# Altium footprint library Connectors.PcbLib: 101 footprints (part 2 of 7)
Each footprint in its own frame and in the unit in brackets; x right, y up, seen from the top. Pads: shape width x height; smd on the part's side, far side on the other; paste and mask are expansions set on the pad; w line width, h text height; cw(c..) or ccw(c..) is an arc to the next point about the centre after c.
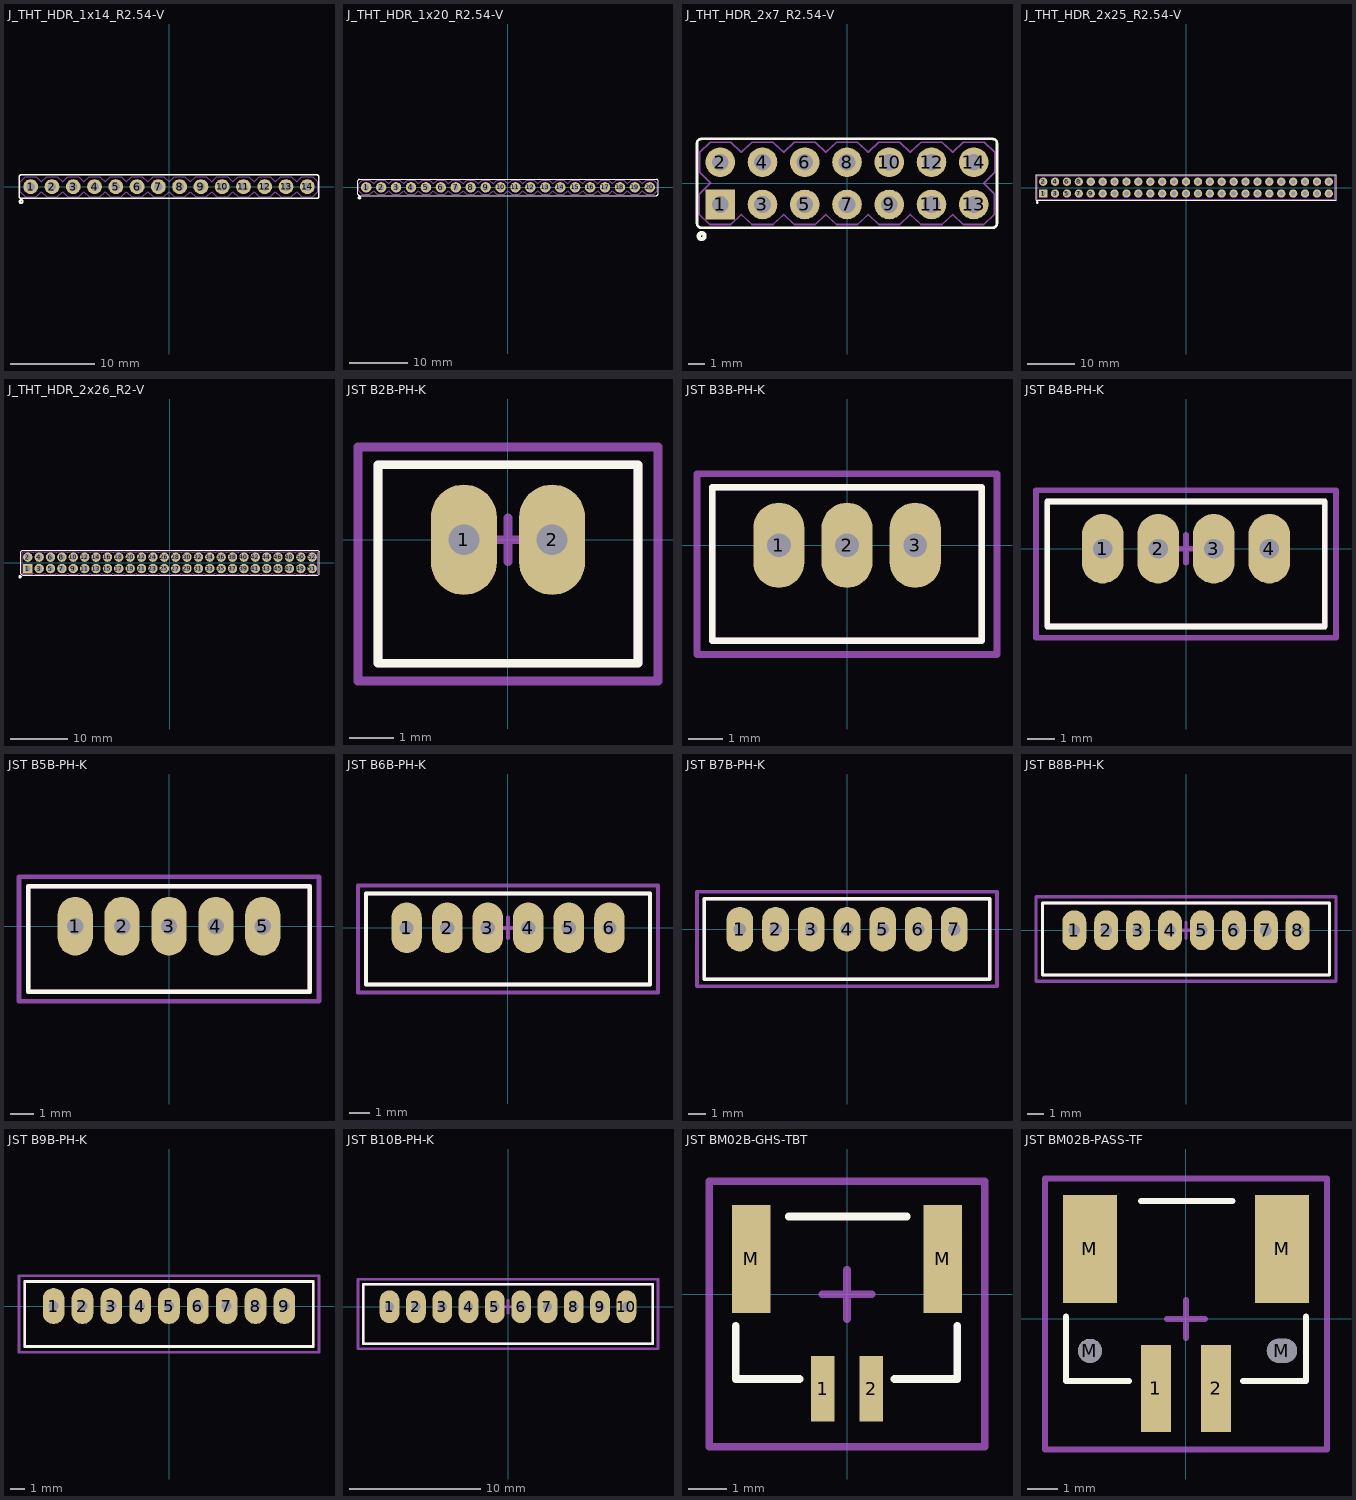
[diagram p1: the footprints below, top view; thin cyan lines are the x and y axes]

## J_THT_HDR_1x14_R2.54-V [mil] "EMED"
height 456.69
pads (14):
  round 70 hole 40: 1(-650,0) 2(-550,0) 3(-450,0) 4(-350,0) 5(-250,0) 6(-150,0) 7(-50,0) 8(50,0) 9(150,0) 10(250,0) 11(350,0) 12(450,0) 13(550,0) 14(650,0)
Top Overlay:
  circle w10: c-695,-70 r7
  lines w6: -705,-45 ccw(c-695,-45) -695,-55 695,-55 ccw(c695,-45) 705,-45 705,45 ccw(c695,45) 695,55 -695,55 ccw(c-695,45) -705,45 -705,-45
Mechanical 1:
  lines w3.94: -700,-23.62 -675,-47.24 -625,-47.24 -600,-23.62 -575,-47.24 -525,-47.24 -500,-23.62 -475,-47.24 -425,-47.24 -400,-23.62 -375,-47.24 -325,-47.24 -300,-23.62 -275,-47.24 -225,-47.24 -200,-23.62 -175,-47.24 -125,-47.24 -100,-23.62 -75,-47.24 -25,-47.24 0,-23.62 25,-47.24 75,-47.24 100,-23.62 125,-47.24 175,-47.24 200,-23.62 225,-47.24 275,-47.24 300,-23.62 325,-47.24 375,-47.24 400,-23.62 425,-47.24 475,-47.24 500,-23.62 525,-47.24 575,-47.24 600,-23.62 625,-47.24 675,-47.24 700,-23.62 700,23.62 675,47.24 625,47.24 600,23.62 575,47.24 525,47.24 500,23.62 475,47.24 425,47.24 400,23.62 375,47.24 325,47.24 300,23.62 275,47.24 225,47.24 200,23.62 175,47.24 125,47.24 100,23.62 75,47.24 25,47.24 0,23.62 -25,47.24 -75,47.24 -100,23.62 -125,47.24 -175,47.24 -200,23.62 -225,47.24 -275,47.24 -300,23.62 -325,47.24 -375,47.24 -400,23.62 -425,47.24 -475,47.24 -500,23.62 -525,47.24 -575,47.24 -600,23.62 -625,47.24 -675,47.24 -700,23.62 -700,-23.62
3D body: height 78.74, standoff 0, extent -700,-47.24 700,47.24
3D body: height 338.58, standoff -114.17, extent -661.81,-11.81 -638.19,11.81
3D body: height 338.58, standoff -114.17, extent -561.81,-11.81 -538.19,11.81
3D body: height 338.58, standoff -114.17, extent -461.81,-11.81 -438.19,11.81
3D body: height 338.58, standoff -114.17, extent -361.81,-11.81 -338.19,11.81
3D body: height 338.58, standoff -114.17, extent -261.81,-11.81 -238.19,11.81
3D body: height 338.58, standoff -114.17, extent -161.81,-11.81 -138.19,11.81
3D body: height 338.58, standoff -114.17, extent -61.81,-11.81 -38.19,11.81
3D body: height 338.58, standoff -114.17, extent 38.19,-11.81 61.81,11.81
3D body: height 338.58, standoff -114.17, extent 138.19,-11.81 161.81,11.81
3D body: height 338.58, standoff -114.17, extent 238.19,-11.81 261.81,11.81
3D body: height 338.58, standoff -114.17, extent 338.19,-11.81 361.81,11.81
3D body: height 338.58, standoff -114.17, extent 438.19,-11.81 461.81,11.81
3D body: height 338.58, standoff -114.17, extent 538.19,-11.81 561.81,11.81
3D body: height 338.58, standoff -114.17, extent 638.19,-11.81 661.81,11.81

## J_THT_HDR_1x20_R2.54-V [mil] "1x20pin, listwa mêska, THT, prosta"
pads (20):
  round 70 hole 40: 1(-950,0) 2(-850,0) 3(-750,0) 4(-650,0) 5(-550,0) 6(-450,0) 7(-350,0) 8(-250,0) 9(-150,0) 10(-50,0) 11(50,0) 12(150,0) 13(250,0) 14(350,0) 15(450,0) 16(550,0) 17(650,0) 18(750,0) 19(850,0) 20(950,0)
Top Overlay:
  circle w10: c-995,-70 r7
  lines w6: -1005,-45 ccw(c-995,-45) -995,-55 995,-55 ccw(c995,-45) 1005,-45 1005,45 ccw(c995,45) 995,55 -995,55 ccw(c-995,45) -1005,45 -1005,-45
Mechanical 1:
  lines w3.94: -1000,-23.62 -975,-47.24 -925,-47.24 -900,-23.62 -875,-47.24 -825,-47.24 -800,-23.62 -775,-47.24 -725,-47.24 -700,-23.62 -675,-47.24 -625,-47.24 -600,-23.62 -575,-47.24 -525,-47.24 -500,-23.62 -475,-47.24 -425,-47.24 -400,-23.62 -375,-47.24 -325,-47.24 -300,-23.62 -275,-47.24 -225,-47.24 -200,-23.62 -175,-47.24 -125,-47.24 -100,-23.62 -75,-47.24 -25,-47.24 0,-23.62 25,-47.24 75,-47.24 100,-23.62 125,-47.24 175,-47.24 200,-23.62 225,-47.24 275,-47.24 300,-23.62 325,-47.24 375,-47.24 400,-23.62 425,-47.24 475,-47.24 500,-23.62 525,-47.24 575,-47.24 600,-23.62 625,-47.24 675,-47.24 700,-23.62 725,-47.24 775,-47.24 800,-23.62 825,-47.24 875,-47.24 900,-23.62 925,-47.24 975,-47.24 1000,-23.62 1000,23.62 975,47.24 925,47.24 900,23.62 875,47.24 825,47.24 800,23.62 775,47.24 725,47.24 700,23.62 675,47.24 625,47.24 600,23.62 575,47.24 525,47.24 500,23.62 475,47.24 425,47.24 400,23.62 375,47.24 325,47.24 300,23.62 275,47.24 225,47.24 200,23.62 175,47.24 125,47.24 100,23.62 75,47.24 25,47.24 0,23.62 -25,47.24 -75,47.24 -100,23.62 -125,47.24 -175,47.24 -200,23.62 -225,47.24 -275,47.24 -300,23.62 -325,47.24 -375,47.24 -400,23.62 -425,47.24 -475,47.24 -500,23.62 -525,47.24 -575,47.24 -600,23.62 -625,47.24 -675,47.24 -700,23.62 -725,47.24 -775,47.24 -800,23.62 -825,47.24 -875,47.24 -900,23.62 -925,47.24 -975,47.24 -1000,23.62 -1000,-23.62
3D body: height 78.74, standoff 0, extent -1000,-47.24 1000,47.24
3D body: height 338.58, standoff -114.17, extent -961.81,-11.81 -938.19,11.81
3D body: height 338.58, standoff -114.17, extent -861.81,-11.81 -838.19,11.81
3D body: height 338.58, standoff -114.17, extent -761.81,-11.81 -738.19,11.81
3D body: height 338.58, standoff -114.17, extent -661.81,-11.81 -638.19,11.81
3D body: height 338.58, standoff -114.17, extent -561.81,-11.81 -538.19,11.81
3D body: height 338.58, standoff -114.17, extent -461.81,-11.81 -438.19,11.81
3D body: height 338.58, standoff -114.17, extent -361.81,-11.81 -338.19,11.81
3D body: height 338.58, standoff -114.17, extent -261.81,-11.81 -238.19,11.81
3D body: height 338.58, standoff -114.17, extent -161.81,-11.81 -138.19,11.81
3D body: height 338.58, standoff -114.17, extent -61.81,-11.81 -38.19,11.81
3D body: height 338.58, standoff -114.17, extent 38.19,-11.81 61.81,11.81
3D body: height 338.58, standoff -114.17, extent 138.19,-11.81 161.81,11.81
3D body: height 338.58, standoff -114.17, extent 238.19,-11.81 261.81,11.81
3D body: height 338.58, standoff -114.17, extent 338.19,-11.81 361.81,11.81
3D body: height 338.58, standoff -114.17, extent 438.19,-11.81 461.81,11.81
3D body: height 338.58, standoff -114.17, extent 538.19,-11.81 561.81,11.81
3D body: height 338.58, standoff -114.17, extent 638.19,-11.81 661.81,11.81
3D body: height 338.58, standoff -114.17, extent 738.19,-11.81 761.81,11.81
3D body: height 338.58, standoff -114.17, extent 838.19,-11.81 861.81,11.81
3D body: height 338.58, standoff -114.17, extent 938.19,-11.81 961.81,11.81

## J_THT_HDR_2x7_R2.54-V [mil] "EMED"
height 456.69
pads (14):
  rect 70x70 hole 40: 1(-300,-50)
  round 70 hole 40: 2(-300,50) 3(-200,-50) 4(-200,50) 5(-100,-50) 6(-100,50) 7(0,-50) 8(0,50) 9(100,-50) 10(100,50) 11(200,-50) 12(200,50) 13(300,-50) 14(300,50)
Top Overlay:
  circle w10: c-344.09,-124.8 r7
  lines w6: -355,-10.63 -355,95 cw(c-345,95) -345,105 345,105 cw(c345,95) 355,95 355,-6.69 ; -355,-5 -355,-95 ccw(c-345,-95) -345,-105 345,-105 ccw(c345,-95) 355,-95 355,-5
Mechanical 1:
  lines w3.94: -350,-73.62 -350,-26.38 -350,-25.98 -322.83,1.18 -323.43,1.18 -348.62,26.38 -348.62,73.62 -323.62,97.24 -275,97.24 -250,73.62 -225,97.24 -175,97.24 -150,73.62 -125,97.24 -75,97.24 -50,73.62 -25,97.24 25,97.24 50,73.62 75,97.24 125,97.24 150,73.62 175,97.24 225,97.24 250,73.62 275,97.24 325,97.24 350,73.62 350,26.38 324.8,1.18 323.82,0.2 348.62,-24.61 348.62,-26.38 348.62,-73.62 323.62,-97.24 275,-97.24 250,-73.62 225,-97.24 175,-97.24 150,-73.62 125,-97.24 75,-97.24 50,-73.62 25,-97.24 -25,-97.24 -50,-73.62 -75,-97.24 -125,-97.24 -150,-73.62 -175,-97.24 -225,-97.24 -250,-73.62 -275,-97.24 -325,-97.24 -350,-73.62
3D body: height 338.58, standoff -114.17, extent 288.19,-61.81 311.81,-38.19
3D body: height 338.58, standoff -114.17, extent 188.19,-61.81 211.81,-38.19
3D body: height 338.58, standoff -114.17, extent 88.19,-61.81 111.81,-38.19
3D body: height 338.58, standoff -114.17, extent -11.81,-61.81 11.81,-38.19
3D body: height 338.58, standoff -114.17, extent -111.81,-61.81 -88.19,-38.19
3D body: height 338.58, standoff -114.17, extent -211.81,-61.81 -188.19,-38.19
3D body: height 338.58, standoff -114.17, extent -311.81,-61.81 -288.19,-38.19
3D body: height 78.74, standoff 0, extent -350,-97.24 348.62,1.18
3D body: height 78.74, standoff 0, extent -348.62,-2.76 350,97.24
3D body: height 338.58, standoff -114.17, extent 288.19,38.19 311.81,61.81
3D body: height 338.58, standoff -114.17, extent 188.19,38.19 211.81,61.81
3D body: height 338.58, standoff -114.17, extent 88.19,38.19 111.81,61.81
3D body: height 338.58, standoff -114.17, extent -11.81,38.19 11.81,61.81
3D body: height 338.58, standoff -114.17, extent -111.81,38.19 -88.19,61.81
3D body: height 338.58, standoff -114.17, extent -211.81,38.19 -188.19,61.81
3D body: height 338.58, standoff -114.17, extent -311.81,38.19 -288.19,61.81

## J_THT_HDR_2x25_R2.54-V [mil] "EMED"
height 456.69
pads (50):
  rect 70x70 hole 40: 1(-1200,-50)
  round 70 hole 40: 2(-1200,50) 3(-1100,-50) 4(-1100,50) 5(-1000,-50) 6(-1000,50) 7(-900,-50) 8(-900,50) 9(-800,-50) 10(-800,50) 11(-700,-50) 12(-700,50) 13(-600,-50) 14(-600,50) 15(-500,-50) 16(-500,50) 17(-400,-50) 18(-400,50) 19(-300,-50) 20(-300,50) 21(-200,-50) 22(-200,50) 23(-100,-50) 24(-100,50) 25(0,-50) 26(0,50) 27(100,-50) 28(100,50) 29(200,-50) 30(200,50) 31(300,-50) 32(300,50) 33(400,-50) 34(400,50) 35(500,-50) 36(500,50) 37(600,-50) 38(600,50) 39(700,-50) 40(700,50) 41(800,-50) 42(800,50) 43(900,-50) 44(900,50) 45(1000,-50) 46(1000,50) 47(1100,-50) 48(1100,50) 49(1200,-50) 50(1200,50)
Top Overlay:
  circle w10: c-1250,-125 r7
  rectangle: 1190,-60 1210,-40
  rectangle: 1190,40 1210,60
  rectangle: 890,-60 910,-40
  rectangle: 890,40 910,60
  rectangle: 1090,-60 1110,-40
  rectangle: 990,-60 1010,-40
  rectangle: 1090,40 1110,60
  rectangle: 990,40 1010,60
  rectangle: 790,-60 810,-40
  rectangle: 790,40 810,60
  rectangle: 490,-60 510,-40
  rectangle: 390,-60 410,-40
  rectangle: 290,-60 310,-40
  rectangle: 490,40 510,60
  rectangle: 390,40 410,60
  rectangle: 290,40 310,60
  rectangle: 690,-60 710,-40
  rectangle: 590,-60 610,-40
  rectangle: 190,-60 210,-40
  rectangle: 90,-60 110,-40
  rectangle: 690,40 710,60
  rectangle: 590,40 610,60
  rectangle: 190,40 210,60
  rectangle: 90,40 110,60
  rectangle: -310,-60 -290,-40
  rectangle: -410,-60 -390,-40
  rectangle: -310,40 -290,60
  rectangle: -410,40 -390,60
  rectangle: -810,-60 -790,-40
  rectangle: -810,40 -790,60
  rectangle: -210,-60 -190,-40
  rectangle: -210,40 -190,60
  rectangle: -910,40 -890,60
  rectangle: -910,-60 -890,-40
  rectangle: -710,-60 -690,-40
  rectangle: -610,-60 -590,-40
  rectangle: -1010,-60 -990,-40
  rectangle: -1210,-60 -1190,-40
  rectangle: -1110,-60 -1090,-40
  rectangle: -710,40 -690,60
  rectangle: -610,40 -590,60
  rectangle: -1010,40 -990,60
  rectangle: -1210,40 -1190,60
  rectangle: -1110,40 -1090,60
  rectangle: -110,-60 -90,-40
  rectangle: -510,-60 -490,-40
  rectangle: -510,40 -490,60
  rectangle: -110,40 -90,60
  rectangle: -10,-60 10,-40
  rectangle: -10,40 10,60
  lines w6: -1260,-108.27 1260,-108.27 1260,108.26 -1260,108.26 -1260,-108.27
Mechanical 1:
  lines w3.94: -1250,-98.43 -1250,98.42 1250,98.42 1250,-98.43 -1250,-98.43
3D body "HDR2X25.stp": height 316.54, standoff -136.22, extent -1249,-101 1251,99

## J_THT_HDR_2x26_R2-V [mil] "EMED"
height 460.63
pads (52):
  rect 65x65 hole 40: 1(-984.25,-39.37)
  round 65 hole 40: 2(-984.25,39.37) 3(-905.51,-39.37) 4(-905.51,39.37) 5(-826.77,-39.37) 6(-826.77,39.37) 7(-748.03,-39.37) 8(-748.03,39.37) 9(-669.29,-39.37) 10(-669.29,39.37) 11(-590.55,-39.37) 12(-590.55,39.37) 13(-511.81,-39.37) 14(-511.81,39.37) 15(-433.07,-39.37) 16(-433.07,39.37) 17(-354.33,-39.37) 18(-354.33,39.37) 19(-275.59,-39.37) 20(-275.59,39.37) 21(-196.85,-39.37) 22(-196.85,39.37) 23(-118.11,-39.37) 24(-118.11,39.37) 25(-39.37,-39.37) 26(-39.37,39.37) 27(39.37,-39.37) 28(39.37,39.37) 29(118.11,-39.37) 30(118.11,39.37) 31(196.85,-39.37) 32(196.85,39.37) 33(275.59,-39.37) 34(275.59,39.37) 35(354.33,-39.37) 36(354.33,39.37) 37(433.07,-39.37) 38(433.07,39.37) 39(511.81,-39.37) 40(511.81,39.37) 41(590.55,-39.37) 42(590.55,39.37) 43(669.29,-39.37) 44(669.29,39.37) 45(748.03,-39.37) 46(748.03,39.37) 47(826.77,-39.37) 48(826.77,39.37) 49(905.51,-39.37) 50(905.51,39.37) 51(984.25,-39.37) 52(984.25,39.37)
Top Overlay:
  circle w10: c-1038,-95 r7
  lines w5.98: -1031.5,-73.5 -1031.5,78.5 -1023.39,86.61 1023.39,86.61 1031.5,78.5 1031.5,-78.5 1023.39,-86.61 -1018.39,-86.61 -1031.5,-73.5
Mechanical 1:
  drawing of 158 lines, arcs and shapes, not listed
3D body: height 342.52, standoff -118.11, extent 29.53,29.53 49.21,49.21
3D body: height 342.52, standoff -118.11, extent 29.53,-49.21 49.21,-29.53
3D body: height 342.52, standoff -118.11, extent -49.21,29.53 -29.53,49.21
3D body: height 342.52, standoff -118.11, extent -49.21,-49.21 -29.53,-29.53
3D body: height 342.52, standoff -118.11, extent -127.95,29.53 -108.27,49.21
3D body: height 342.52, standoff -118.11, extent -127.95,-49.21 -108.27,-29.53
3D body: height 342.52, standoff -118.11, extent -206.69,29.53 -187.01,49.21
3D body: height 342.52, standoff -118.11, extent -206.69,-49.21 -187.01,-29.53
3D body: height 342.52, standoff -118.11, extent -285.43,29.53 -265.75,49.21
3D body: height 342.52, standoff -118.11, extent -285.43,-49.21 -265.75,-29.53
3D body: height 342.52, standoff -118.11, extent -364.17,29.53 -344.49,49.21
3D body: height 342.52, standoff -118.11, extent -364.18,-49.21 -344.49,-29.53
3D body: height 342.52, standoff -118.11, extent -442.91,29.53 -423.23,49.21
3D body: height 342.52, standoff -118.11, extent -442.92,-49.21 -423.23,-29.53
3D body: height 342.52, standoff -118.11, extent -521.65,29.53 -501.97,49.21
3D body: height 342.52, standoff -118.11, extent -521.66,-49.21 -501.97,-29.53
3D body: height 342.52, standoff -118.11, extent -600.39,29.53 -580.71,49.21
3D body: height 342.52, standoff -118.11, extent -600.4,-49.21 -580.71,-29.53
3D body: height 342.52, standoff -118.11, extent -679.13,29.53 -659.45,49.21
3D body: height 342.52, standoff -118.11, extent -679.14,-49.21 -659.45,-29.53
3D body: height 342.52, standoff -118.11, extent -757.88,29.53 -738.19,49.21
3D body: height 342.52, standoff -118.11, extent -757.88,-49.21 -738.19,-29.53
3D body: height 78.74, standoff 3.94, extent 0,-78.74 85,78.74
3D body: height 78.74, standoff 3.94, extent -78.74,-78.74 10,78.74
3D body: height 78.74, standoff 3.94, extent -157.48,-78.74 -70,78.74
3D body: height 78.74, standoff 3.94, extent -236.22,-78.74 -150,78.74
3D body: height 78.74, standoff 3.94, extent -314.96,-78.74 -230,78.74
3D body: height 78.74, standoff 3.94, extent -393.7,-78.74 -305,78.74
3D body: height 78.74, standoff 3.94, extent -472.44,-78.74 -385,78.74
3D body: height 78.74, standoff 3.94, extent -551.18,-78.74 -465,78.74
3D body: height 78.74, standoff 3.94, extent -629.92,-78.74 -545,78.74
3D body: height 78.74, standoff 3.94, extent -708.66,-78.74 -625,78.74
3D body: height 78.74, standoff 3.94, extent -787.4,-78.74 -705,78.74
3D body: height 78.74, standoff 3.94, extent -944.88,-78.74 -860,78.74
3D body: height 342.52, standoff -118.11, extent -915.36,-49.21 -895.67,-29.53
3D body: height 342.52, standoff -118.11, extent -915.36,29.53 -895.67,49.21
3D body: height 342.52, standoff -118.11, extent -994.1,29.53 -974.41,49.21
3D body: height 342.52, standoff -118.11, extent -994.1,-49.21 -974.41,-29.53
3D body: height 78.74, standoff 0, extent -1023.62,-78.74 -940,78.74
3D body: height 78.74, standoff 3.94, extent -866.14,-78.74 -785,78.74
3D body: height 342.52, standoff -118.11, extent -836.62,-49.21 -816.93,-29.53
3D body: height 342.52, standoff -118.11, extent -836.62,29.53 -816.93,49.21
3D body: height 78.74, standoff 3.94, extent 78.74,-78.74 165,78.74
3D body: height 78.74, standoff 3.94, extent 157.48,-78.74 245,78.74
3D body: height 78.74, standoff 3.94, extent 236.22,-78.74 325,78.74
3D body: height 78.74, standoff 3.94, extent 314.96,-78.74 405,78.74
3D body: height 78.74, standoff 3.94, extent 393.7,-78.74 480,78.74
3D body: height 78.74, standoff 3.94, extent 472.44,-78.74 565,78.74
3D body: height 78.74, standoff 3.94, extent 551.18,-78.74 640,78.74
3D body: height 78.74, standoff 3.94, extent 629.92,-78.74 715,78.74
3D body: height 78.74, standoff 3.94, extent 708.66,-78.74 795,78.74
3D body: height 342.52, standoff -118.11, extent 108.27,-49.21 127.95,-29.53
3D body: height 342.52, standoff -118.11, extent 108.27,29.53 127.95,49.21
3D body: height 342.52, standoff -118.11, extent 187.01,-49.21 206.69,-29.53
3D body: height 342.52, standoff -118.11, extent 187.01,29.53 206.69,49.21
3D body: height 342.52, standoff -118.11, extent 265.75,-49.21 285.43,-29.53
3D body: height 342.52, standoff -118.11, extent 265.75,29.53 285.43,49.21
3D body: height 342.52, standoff -118.11, extent 344.49,-49.21 364.17,-29.53
3D body: height 342.52, standoff -118.11, extent 344.49,29.53 364.17,49.21
3D body: height 342.52, standoff -118.11, extent 423.23,-49.21 442.91,-29.53
3D body: height 342.52, standoff -118.11, extent 423.23,29.53 442.91,49.21
3D body: height 342.52, standoff -118.11, extent 501.97,-49.21 521.65,-29.53
3D body: height 342.52, standoff -118.11, extent 501.97,29.53 521.65,49.21
3D body: height 342.52, standoff -118.11, extent 580.71,-49.21 600.39,-29.53
3D body: height 342.52, standoff -118.11, extent 580.71,29.53 600.39,49.21
3D body: height 342.52, standoff -118.11, extent 659.45,-49.21 679.13,-29.53
3D body: height 342.52, standoff -118.11, extent 659.45,29.53 679.13,49.21
3D body: height 342.52, standoff -118.11, extent 738.19,-49.21 757.87,-29.53
3D body: height 342.52, standoff -118.11, extent 738.19,29.53 757.87,49.21
3D body: height 342.52, standoff -118.11, extent 895.67,29.53 915.35,49.21
3D body: height 342.52, standoff -118.11, extent 895.67,-49.21 915.35,-29.53
3D body: height 342.52, standoff -118.11, extent 816.93,29.53 836.61,49.21
3D body: height 342.52, standoff -118.11, extent 816.93,-49.21 836.61,-29.53
3D body: height 78.74, standoff 3.94, extent 866.14,-78.74 950,78.74
3D body: height 78.74, standoff 3.94, extent 787.4,-78.74 875,78.74
3D body: height 78.74, standoff 3.94, extent 944.88,-78.74 1023.62,78.74
3D body: height 342.52, standoff -118.11, extent 974.41,-49.21 994.09,-29.53
3D body: height 342.52, standoff -118.11, extent 974.41,29.53 994.09,49.21

## JST B2B-PH-K [mm]
height 6
pads (2):
  oval 1.5x2.5 hole 0.7: 1(-1,0) 2(1,0)
Top Overlay:
  lines w0.2: -2.95,-2.8 2.95,-2.8 2.95,1.7 -2.95,1.7 -2.95,-2.8
Bottom Overlay:
  circle w0.254: c-2.1,1.1 r0.141
Mechanical 13:
  lines w0.2: -2.95,-2.8 -2.95,1.7 2.95,1.7 2.95,-2.8 -2.95,-2.8
Mechanical 15:
  lines w0.2: -0.5,0 0.5,0 ; 0,-0.5 0,0.5 ; -3.4,-3.2 -3.4,2.1 3.4,2.1 3.4,-3.2 -3.4,-3.2
3D body "JST B2B-PH-K-S.STEP": height 6, standoff -3.4, extent -2.95,-2.8 2.95,1.7

## JST B3B-PH-K [mm]
height 6
pads (3):
  oval 1.5x2.5 hole 0.7: 1(-2,0) 2(0,0) 3(2,0)
Top Overlay:
  lines w0.2: -3.95,-2.8 3.95,-2.8 3.95,1.7 -3.95,1.7 -3.95,-2.8
Bottom Overlay:
  circle w0.254: c-3.1,1.1 r0.141
Mechanical 13:
  lines w0.2: -3.95,-2.8 -3.95,1.7 3.95,1.7 3.95,-2.8 -3.95,-2.8
Mechanical 15:
  lines w0.2: -0.5,0 0.5,0 ; 0,-0.5 0,0.5 ; -4.4,-3.2 -4.4,2.1 4.4,2.1 4.4,-3.2 -4.4,-3.2
3D body "JST B3B-PH-K-S.STEP": height 6, standoff -3.4, extent -3.95,-2.8 3.95,1.7

## JST B4B-PH-K [mm]
height 6
pads (4):
  oval 1.5x2.5 hole 0.7: 1(-3,0) 2(-1,0) 3(1,0) 4(3,0)
Top Overlay:
  lines w0.2: -5,-2.8 5,-2.8 5,1.7 -5,1.7 -5,-2.8
Bottom Overlay:
  circle w0.254: c-4.1,1.1 r0.141
Mechanical 13:
  lines w0.2: -5,-2.8 -5,1.7 5,1.7 5,-2.8 -5,-2.8
Mechanical 15:
  lines w0.2: -0.5,0 0.5,0 ; 0,-0.5 0,0.5 ; -5.4,-3.2 -5.4,2.1 5.4,2.1 5.4,-3.2 -5.4,-3.2
3D body "JST B4B-PH-K-S.STEP": height 6, standoff -3.4, extent -4.95,-2.8 4.95,1.7

## JST B5B-PH-K [mm]
height 6
pads (5):
  oval 1.5x2.5 hole 0.7: 1(-4,0) 2(-2,0) 3(0,0) 4(2,0) 5(4,0)
Top Overlay:
  lines w0.2: -6,-2.8 -6,1.7 6,1.7 6,-2.8 -6,-2.8
Bottom Overlay:
  circle w0.254: c-5.1,1.1 r0.141
Mechanical 13:
  lines w0.2: -6,-2.8 6,-2.8 6,1.7 -6,1.7 -6,-2.8
Mechanical 15:
  lines w0.2: -0.5,0 0.5,0 ; 0,-0.5 0,0.5 ; -6.4,-3.2 6.4,-3.2 6.4,2.1 -6.4,2.1 -6.4,-3.2
3D body "JST B5B-PH-K-S.STEP": height 6, standoff -3.4, extent -5.95,-2.8 5.95,1.7

## JST B6B-PH-K [mm]
height 6
pads (6):
  oval 1.5x2.5 hole 0.7: 1(-5,0) 2(-3,0) 3(-1,0) 4(1,0) 5(3,0) 6(5,0)
Top Overlay:
  lines w0.2: -7,-2.8 -7,1.7 7,1.7 7,-2.8 -7,-2.8
Bottom Overlay:
  circle w0.254: c-6.1,1.1 r0.141
Mechanical 13:
  lines w0.2: 6.95,-2.8 -7,-2.8 -7,1.7 7,1.7 7,-2.8
Mechanical 15:
  lines w0.2: -0.5,0 0.5,0 ; 0,-0.5 0,0.5 ; -7.4,-3.2 7.4,-3.2 7.4,2.1 -7.4,2.1 -7.4,-3.2
3D body "JST B6B-PH-K-S.STEP": height 6, standoff -3.4, extent -6.95,-2.8 6.95,1.7

## JST B7B-PH-K [mm]
height 6
pads (7):
  oval 1.5x2.5 hole 0.7: 1(-6,0) 2(-4,0) 3(-2,0) 4(0,0) 5(2,0) 6(4,0) 7(6,0)
Top Overlay:
  lines w0.2: -8,-2.8 8,-2.8 8,1.7 -8,1.7 -8,-2.8
Bottom Overlay:
  circle w0.254: c-7.1,1.1 r0.141
Mechanical 13:
  lines w0.2: -8,-2.8 -8,1.7 8,1.7 8,-2.8 -8,-2.8
Mechanical 15:
  lines w0.2: -0.5,0 0.5,0 ; 0,-0.5 0,0.5 ; -8.4,-3.2 -8.4,2.1 8.4,2.1 8.4,-3.2 -8.4,-3.2
3D body "JST B7B-PH-K-S.STEP": height 6, standoff -3.4, extent -7.95,-2.8 7.95,1.7

## JST B8B-PH-K [mm]
height 6
pads (8):
  oval 1.5x2.5 hole 0.7: 1(-7,0) 2(-5,0) 3(-3,0) 4(-1,0) 5(1,0) 6(3,0) 7(5,0) 8(7,0)
Top Overlay:
  lines w0.2: -9,-2.8 9,-2.8 9,1.7 -9,1.7 -9,-2.8
Bottom Overlay:
  circle w0.254: c-8.1,1.1 r0.141
Mechanical 13:
  lines w0.2: 8.95,1.7 -9,1.7 -9,-2.8 9,-2.8 9,1.7
Mechanical 15:
  lines w0.2: -0.5,0 0.5,0 ; 0,-0.5 0,0.5 ; -9.4,-3.2 -9.4,2.1 9.4,2.1 9.4,-3.2 -9.4,-3.2
3D body "JST B8B-PH-K-S.STEP": height 6, standoff -3.4, extent -8.95,-2.8 8.95,1.7

## JST B9B-PH-K [mm]
height 6
pads (9):
  oval 1.5x2.5 hole 0.7: 1(-8,0) 2(-6,0) 3(-4,0) 4(-2,0) 5(0,0) 6(2,0) 7(4,0) 8(6,0) 9(8,0)
Top Overlay:
  lines w0.2: -10,-2.8 -10,1.7 10,1.7 10,-2.8 -10,-2.8
Bottom Overlay:
  circle w0.254: c-9.1,1.1 r0.141
Mechanical 13:
  lines w0.2: -10,-2.8 10,-2.8 10,1.7 -10,1.7 -10,-2.8
Mechanical 15:
  lines w0.2: -0.5,0 0.5,0 ; 0,-0.5 0,0.5 ; -10.4,-3.2 10.4,-3.2 10.4,2.1 -10.4,2.1 -10.4,-3.2
3D body "JST B9B-PH-K-S.STEP": height 6, standoff -3.4, extent -9.95,-2.8 9.95,1.7

## JST B10B-PH-K [mm]
height 6
pads (10):
  oval 1.5x2.5 hole 0.7: 1(-9,0) 2(-7,0) 3(-5,0) 4(-3,0) 5(-1,0) 6(1,0) 7(3,0) 8(5,0) 9(7,0) 10(9,0)
Top Overlay:
  lines w0.2: -11,-2.8 11,-2.8 11,1.7 -11,1.7 -11,-2.8
Bottom Overlay:
  circle w0.254: c-10.1,1.1 r0.141
Mechanical 13:
  lines w0.2: 10.95,-2.8 -11,-2.8 -11,1.7 11,1.7 11,-2.8
Mechanical 15:
  lines w0.2: -0.5,0 0.5,0 ; 0,-0.5 0,0.5 ; -11.4,-3.2 -11.4,2.1 11.4,2.1 11.4,-3.2 -11.4,-3.2
3D body "JST B10B-PH-K-S.STEP": height 6, standoff -3.4, extent -10.95,-2.8 10.95,1.7

## JST BM02B-GHS-TBT [mm] "JST GH Series 1.25mm pitch, 4 pin top entry connector"
height 4.5
pads (4):
  rect 0.6x1.7 smd: 1(-0.625,-2.437) 2(0.625,-2.437)
  rect 1x2.8 smd: M(-2.475,0.913) M(2.475,0.913)
Top Overlay:
  lines w0.2: -2.875,-0.812 -2.875,-2.187 -1.225,-2.187 ; -1.504,2.008 1.544,2.008 ; 1.225,-2.187 2.85,-2.187 2.85,-0.812
Mechanical 15:
  lines w0.2: -0.635,0 0.635,0 ; 0,-0.635 0,0.635 ; -3.556,-3.937 3.556,-3.937 3.556,2.921 -3.556,2.921 -3.556,-3.937
3D body "JST BM02B-GHS-TBT.STEP": height 4.18, standoff -0.03, extent -2.875,-2.987 2.875,1.963

## JST BM02B-PASS-TF [mm] "JST PA Series 2mm pitch, top entry connector"
height 11.1
pads (6):
  rect 1x2.9 smd: 1(-1,-2.325) 2(1,-2.325)
  round 0.8 hole 0.8 unplated mask+0.102: M(-3.2,-1.075)
  rect 1.8x3.6 smd: M(-3.2,2.325) M(3.2,2.325)
  oval 1x0.8 hole 0.8 slot 1 at 0 deg unplated mask+0.102: M(3.2,-1.075)
Top Overlay:
  lines w0.2: -4,0.075 -4,-2.075 -1.905,-2.075 ; -1.504,3.92 1.544,3.92 ; 1.905,-2.075 4,-2.075 4,0.075
Mechanical 15:
  lines w0.2: -0.635,-0.015 0.635,-0.015 ; 0,-0.65 0,0.62 ; -4.699,-4.357 4.699,-4.357 4.699,4.66 -4.699,4.66 -4.699,-4.357
3D body "JST BM02B-PASS-TF.STEP": height 9, standoff 0, extent -4,-3.225 4,3.875